# Altium footprint library General.PCBLIB: 226 footprints (part 9 of 15)
Each footprint in its own frame and in the unit in brackets; x right, y up, seen from the top. Pads: shape width x height; smd on the part's side, far side on the other; paste and mask are expansions set on the pad; w line width, h text height; cw(c..) or ccw(c..) is an arc to the next point about the centre after c.
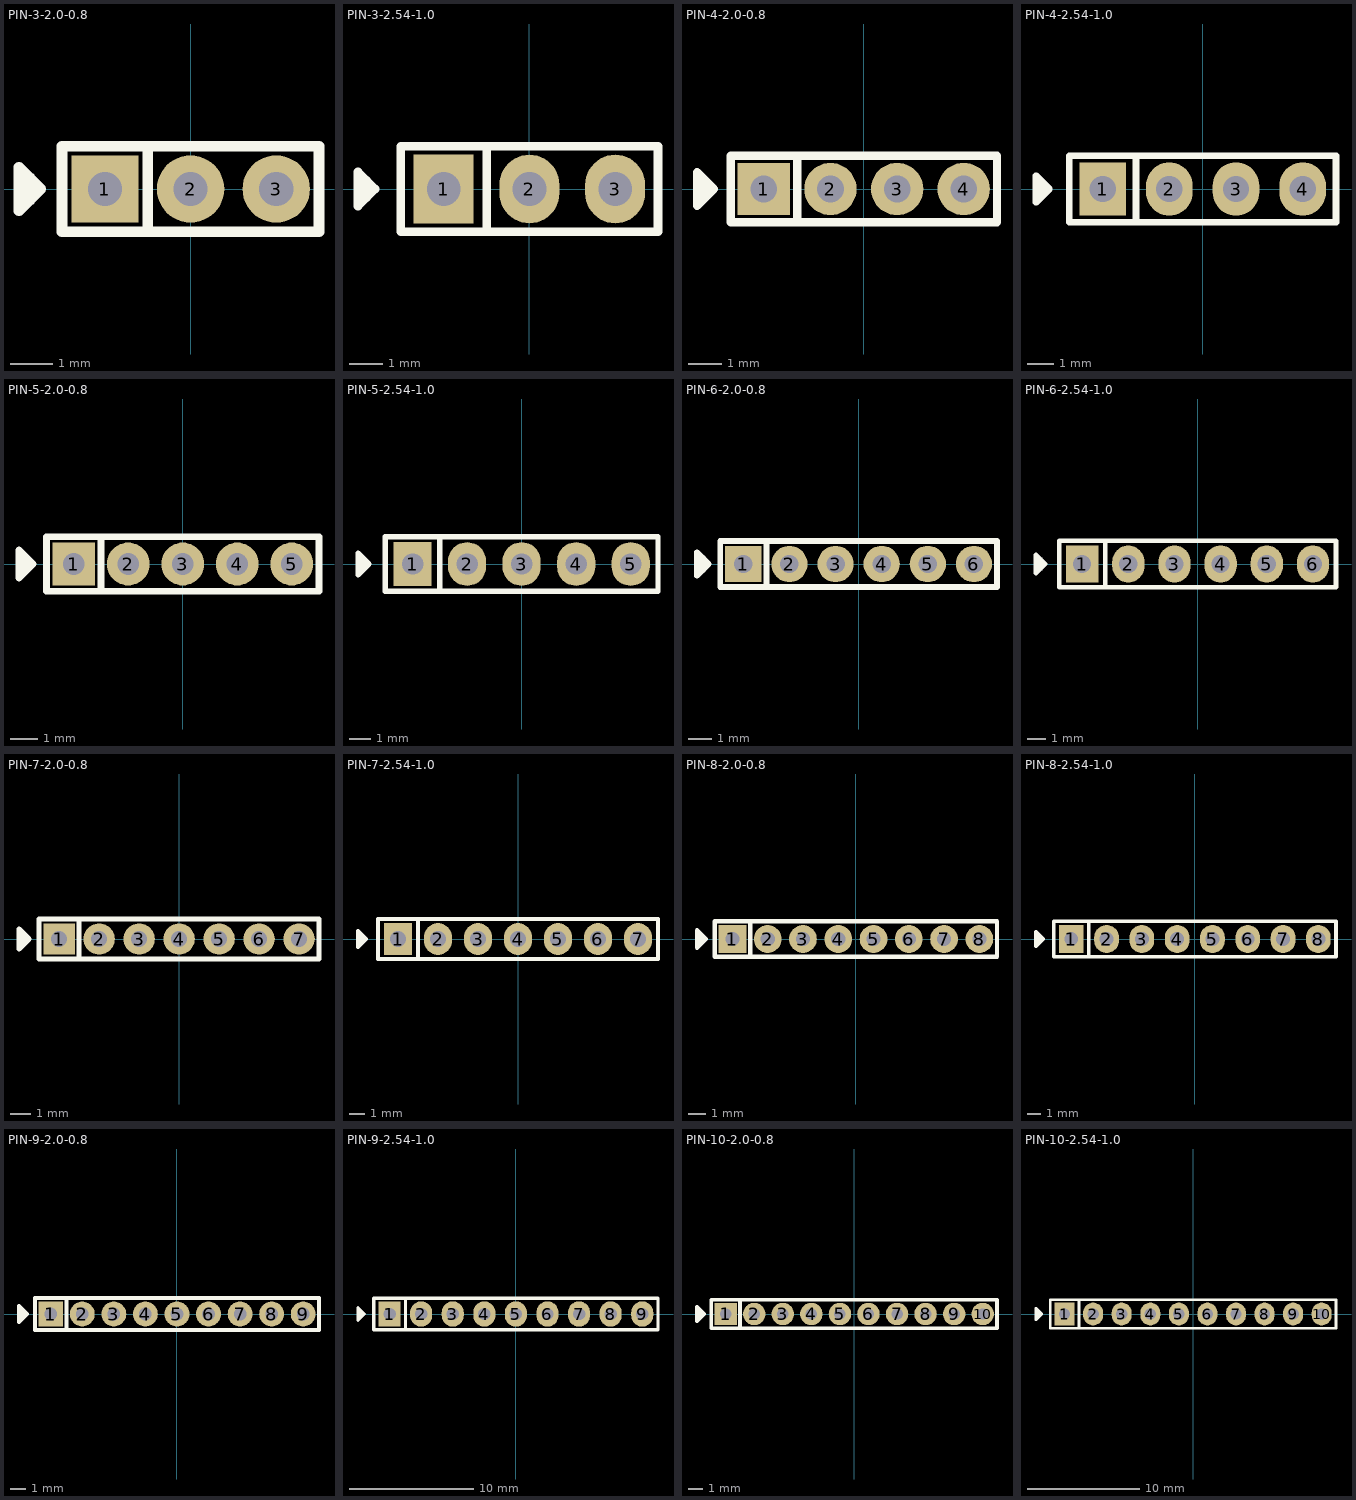
[diagram p8: the footprints below, top view; thin cyan lines are the x and y axes]

## PIN-3-2.0-0.8 [mil] "Pin Header"
height 149.61
pads (3):
  rect 62x62 hole 31.5: 1(-78.74,0)
  round 62 hole 31.5: 2(0,0) 3(78.74,0)
Top Overlay:
  lines w10: -147.8,-10 -147.8,10 ; -39.37,-39.37 -39.37,39.37 ; -157.8,-20 -157.8,20 -137.8,0 -157.8,-20 ; -118.11,-39.37 118.11,-39.37 118.11,39.37 -118.11,39.37 -118.11,-39.37
3D body: height 209, standoff -46, extent -118.11,-39.37 117.99,39.33

## PIN-3-2.54-1.0 [mil] "Pin Header"
height 374.02
pads (3):
  rect 70x80 hole 39.37: 1(-100,0)
  oval 70x80 hole 39.37: 2(0,0) 3(100,0)
Top Overlay:
  lines w10: -190,-10 -190,10 ; -50,-50 -50,50 ; -200,-20 -200,20 -180,0 -200,-20 ; -150,-50 150,-50 150,50 -150,50 -150,-50
3D body: height 397.64, standoff -59.06, extent -150,-50 150,50

## PIN-4-2.0-0.8 [mm] "Pin Header"
height 3.8
pads (4):
  rect 1.575x1.575 hole 0.8: 1(-3,0)
  round 1.575 hole 0.8: 2(-1,0) 3(1,0) 4(3,0)
Top Overlay:
  lines w0.254: -4.754,-0.254 -4.754,0.254 ; -2,-1 -2,1 ; -5.008,-0.508 -4.5,0 -5.008,0.508 -5.008,-0.508 ; -4,-1 -4,1 4,1 4,-1 -4,-1
3D body: height 5.31, standoff -1.17, extent -4,-1 3.996,0.999

## PIN-4-2.54-1.0 [mil] "Pin Header"
height 374.02
pads (4):
  rect 70x80 hole 39.37: 1(-150,0)
  oval 70x80 hole 39.37: 2(-50,0) 3(50,0) 4(150,0)
Top Overlay:
  lines w10: -240,-10 -240,10 ; -100,-50 -100,50 ; -250,-20 -250,20 -230,0 -250,-20 ; -200,-50 -200,50 200,50 200,-50 -200,-50
3D body: height 397.64, standoff -59.06, extent -200,-50 200,50

## PIN-5-2.0-0.8 [mil] "Pin Header"
height 149.61
pads (5):
  rect 62x62 hole 31.5: 1(-157.48,0)
  round 62 hole 31.5: 2(-78.74,0) 3(0,0) 4(78.74,0) 5(157.48,0)
Top Overlay:
  lines w10: -226.54,-10 -226.54,10 ; -118.11,-39.37 -118.11,39.37 ; -236.54,-20 -236.54,20 -216.54,0 -236.54,-20 ; -196.85,-39.37 196.85,-39.37 196.85,39.37 -196.85,39.37 -196.85,-39.37
3D body: height 209, standoff -46, extent -196.85,-39.37 196.65,39.33

## PIN-5-2.54-1.0 [mil] "Pin Header"
height 374.02
pads (5):
  rect 70x80 hole 39.37: 1(-200,0)
  oval 70x80 hole 39.37: 2(-100,0) 3(0,0) 4(100,0) 5(200,0)
Top Overlay:
  lines w10: -290,-10 -290,10 ; -150,-50 -150,50 ; -300,-20 -280,0 -300,20 -300,-20 ; -250,-50 -250,50 250,50 250,-50 -250,-50
3D body: height 397.64, standoff -59.06, extent -250,-50 250,50

## PIN-6-2.0-0.8 [mm] "Pin Header"
height 3.8
pads (6):
  rect 1.575x1.575 hole 0.8: 1(-5,0)
  round 1.575 hole 0.8: 2(-3,0) 3(-1,0) 4(1,0) 5(3,0) 6(5,0)
Top Overlay:
  lines w0.254: -6.754,-0.254 -6.754,0.254 ; -4,-1 -4,1 ; -7.008,-0.508 -7.008,0.508 -6.5,0 -7.008,-0.508 ; -6,-1 6,-1 6,1 -6,1 -6,-1
3D body: height 5.31, standoff -1.17, extent -6,-1 5.994,0.999

## PIN-6-2.54-1.0 [mil] "Pin Header"
height 374.02
pads (6):
  rect 70x80 hole 39.37: 1(-250,0)
  oval 70x80 hole 39.37: 2(-150,0) 3(-50,0) 4(50,0) 5(150,0) 6(250,0)
Top Overlay:
  lines w10: -340,-10 -340,10 ; -200,-50 -200,50 ; -350,-20 -330,0 -350,20 -350,-20 ; -300,-50 300,-50 300,50 -300,50 -300,-50
3D body: height 397.64, standoff -59.06, extent -300,-50 300,50

## PIN-7-2.0-0.8 [mil] "Pin Header"
height 149.61
pads (7):
  rect 62x62 hole 31.5: 1(-236.22,0)
  round 62 hole 31.5: 2(-157.48,0) 3(-78.74,0) 4(0,0) 5(78.74,0) 6(157.48,0) 7(236.22,0)
Top Overlay:
  lines w10: -305.28,-10 -305.28,10 ; -196.85,-39.37 -196.85,39.37 ; -315.28,-20 -295.28,0 -315.28,20 -315.28,-20 ; -275.59,-39.37 -275.59,39.37 275.59,39.37 275.59,-39.37 -275.59,-39.37
3D body: height 209, standoff -46, extent -275.59,-39.37 275.31,39.33

## PIN-7-2.54-1.0 [mil] "Pin Header"
height 374.02
pads (7):
  rect 70x80 hole 39.37: 1(-300,0)
  oval 70x80 hole 39.37: 2(-200,0) 3(-100,0) 4(0,0) 5(100,0) 6(200,0) 7(300,0)
Top Overlay:
  lines w10: -390,-10 -390,10 ; -250,-50 -250,50 ; -400,-20 -380,0 -400,20 -400,-20 ; -350,-50 350,-50 350,50 -350,50 -350,-50
3D body: height 397.64, standoff -59.06, extent -350,-50 350,50

## PIN-8-2.0-0.8 [mm] "Pin Header"
height 3.8
pads (8):
  rect 1.575x1.575 hole 0.8: 1(-7,0)
  round 1.575 hole 0.8: 2(-5,0) 3(-3,0) 4(-1,0) 5(1,0) 6(3,0) 7(5,0) 8(7,0)
Top Overlay:
  lines w0.254: -8.754,-0.254 -8.754,0.254 ; -6,-1 -6,1 ; -9.008,-0.508 -9.008,0.508 -8.5,0 -9.008,-0.508 ; -8,-1 8,-1 8,1 -8,1 -8,-1
3D body: height 5.31, standoff -1.17, extent -8,-1 7.992,0.999

## PIN-8-2.54-1.0 [mil] "Pin Header"
height 374.02
pads (8):
  rect 70x80 hole 39.37: 1(-350,0)
  oval 70x80 hole 39.37: 2(-250,0) 3(-150,0) 4(-50,0) 5(50,0) 6(150,0) 7(250,0) 8(350,0)
Top Overlay:
  lines w10: -440,-10 -440,10 ; -300,-50 -300,50 ; -450,-20 -450,20 -430,0 -450,-20 ; -400,-50 -400,50 400,50 400,-50 -400,-50
3D body: height 397.64, standoff -59.06, extent -400,-50 400,50

## PIN-9-2.0-0.8 [mil] "Pin Header"
height 149.61
pads (9):
  rect 62x62 hole 31.5: 1(-314.96,0)
  round 62 hole 31.5: 2(-236.22,0) 3(-157.48,0) 4(-78.74,0) 5(0,0) 6(78.74,0) 7(157.48,0) 8(236.22,0) 9(314.96,0)
Top Overlay:
  lines w10: -384.02,-10 -384.02,10 ; -275.59,-39.37 -275.59,39.37 ; -394.02,-20 -374.02,0 -394.02,20 -394.02,-20 ; -354.33,-39.37 -354.33,39.37 354.33,39.37 354.33,-39.37 -354.33,-39.37
3D body: height 209, standoff -46, extent -354.33,-39.37 353.97,39.33

## PIN-9-2.54-1.0 [mil] "Pin Header"
height 374.02
pads (9):
  rect 70x80 hole 39.37: 1(-400,0)
  oval 70x80 hole 39.37: 2(-300,0) 3(-200,0) 4(-100,0) 5(0,0) 6(100,0) 7(200,0) 8(300,0) 9(400,0)
Top Overlay:
  lines w10: -490,-10 -490,10 ; -350,-50 -350,50 ; -500,-20 -500,20 -480,0 -500,-20 ; -450,-50 -450,50 450,50 450,-50 -450,-50
3D body: height 397.64, standoff -59.06, extent -450,-50 450,50

## PIN-10-2.0-0.8 [mm] "Pin Header"
height 3.8
pads (10):
  rect 1.575x1.575 hole 0.8: 1(-9,0)
  round 1.575 hole 0.8: 2(-7,0) 3(-5,0) 4(-3,0) 5(-1,0) 6(1,0) 7(3,0) 8(5,0) 9(7,0) 10(9,0)
Top Overlay:
  lines w0.254: -10.754,-0.254 -10.754,0.254 ; -8,-1 -8,1 ; -11.008,-0.508 -11.008,0.508 -10.5,0 -11.008,-0.508 ; -10,-1 10,-1 10,1 -10,1 -10,-1
3D body: height 5.31, standoff -1.17, extent -10,-1 9.99,0.999

## PIN-10-2.54-1.0 [mil] "Pin Header"
height 374.02
pads (10):
  rect 70x80 hole 39.37: 1(-450,0)
  oval 70x80 hole 39.37: 2(-350,0) 3(-250,0) 4(-150,0) 5(-50,0) 6(50,0) 7(150,0) 8(250,0) 9(350,0) 10(450,0)
Top Overlay:
  lines w10: -540,-10 -540,10 ; -400,-50 -400,50 ; -550,-20 -530,0 -550,20 -550,-20 ; -500,-50 500,-50 500,50 -500,50 -500,-50
3D body: height 397.64, standoff -59.06, extent -500,-50 500,50